# Altium footprint library LimeNet-Micro_2v1.PcbLib: 86 footprints (part 6 of 6)
Each footprint in its own frame and in the unit in brackets; x right, y up, seen from the top. Pads: shape width x height; smd on the part's side, far side on the other; paste and mask are expansions set on the pad; w line width, h text height; cw(c..) or ccw(c..) is an arc to the next point about the centre after c.
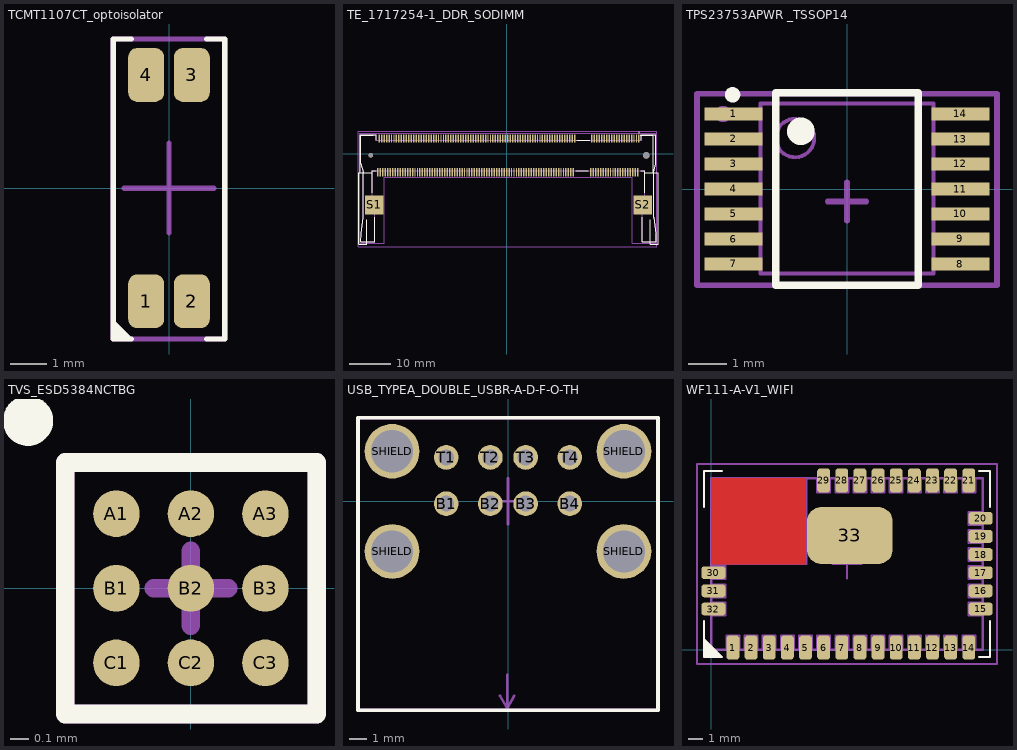
[diagram p5: the footprints below, top view; thin cyan lines are the x and y axes]

## TCMT1107CT_optoisolator [mm]
pads (4):
  rrect50% 1x1.5 smd mask+0.05: 1(-0.635,-3.15) 2(0.635,-3.15) 3(0.635,3.15) 4(-0.635,3.15)
Top Overlay:
  region: -1,-4.2 -1.55,-3.65 -1.55,-4.2
  lines w0.15: -1.05,-4.2 -1.55,-4.2 -1.55,4.15 -1.05,4.15 ; 1.05,-4.2 1.55,-4.2 1.55,4.15 1.05,4.15
Mechanical 15:
  lines w0.15: -1.55,-4.2 -1.55,4.15 1.55,4.15 1.55,-4.2 -1.5,-4.2 ; -1.25,0 0,0 ; 0,-1.25 0,0 ; 0,1.25 0,0 ; 1.25,0 0,0
  text ".Designator" at 0.385,2.15 h0.55
  text "1" at -1.365,-3.475 h0.55
  text "4" at -1.365,3.7 h0.55
3D body "User Library-ACPL-217-56DE.step": height 2.01, standoff -0.12, extent -1.3,-3.55 1.3,3.45

## TE_1717254-1_DDR_SODIMM [mm]
pads (204):
  rect 0.35x2 smd mask+0.05: 1(32.025,3.75) 2(31.725,-4.45) 3(31.425,3.75) 4(31.125,-4.45) 5(30.825,3.75) 6(30.525,-4.45) 7(30.225,3.75) 8(29.925,-4.45) 9(29.625,3.75) 10(29.325,-4.45) 11(29.025,3.75) 12(28.725,-4.45) 13(28.425,3.75) 14(28.125,-4.45) 15(27.825,3.75) 16(27.525,-4.45) 17(27.225,3.75) 18(26.925,-4.45) 19(26.625,3.75) 20(26.325,-4.45) 21(26.025,3.75) 22(25.725,-4.45) 23(25.425,3.75) 24(25.125,-4.45) 25(24.825,3.75) 26(24.525,-4.45) 27(24.225,3.75) 28(23.925,-4.45) 29(23.625,3.75) 30(23.325,-4.45) 31(23.025,3.75) 32(22.725,-4.45) 33(22.425,3.75) 34(22.125,-4.45) 35(21.825,3.75) 36(21.525,-4.45) 37(21.225,3.75) 38(20.925,-4.45) 39(20.625,3.75) 40(20.325,-4.45) 41(16.425,3.75) 42(16.125,-4.45) 43(15.825,3.75) 44(15.525,-4.45) 45(15.225,3.75) 46(14.925,-4.45) 47(14.625,3.75) 48(14.325,-4.45) 49(14.025,3.75) 50(13.725,-4.45) 51(13.425,3.75) 52(13.125,-4.45) 53(12.825,3.75) 54(12.525,-4.45) 55(12.225,3.75) 56(11.925,-4.45) 57(11.625,3.75) 58(11.325,-4.45) 59(11.025,3.75) 60(10.725,-4.45) 61(10.425,3.75) 62(10.125,-4.45) 63(9.825,3.75) 64(9.525,-4.45) 65(9.225,3.75) 66(8.925,-4.45) 67(8.625,3.75) 68(8.325,-4.45) 69(8.025,3.75) 70(7.725,-4.45) 71(7.425,3.75) 72(7.125,-4.45) 73(6.825,3.75) 74(6.525,-4.45) 75(6.225,3.75) 76(5.925,-4.45) 77(5.625,3.75) 78(5.325,-4.45) 79(5.025,3.75) 80(4.725,-4.45) 81(4.425,3.75) 82(4.125,-4.45) 83(3.825,3.75) 84(3.525,-4.45) 85(3.225,3.75) 86(2.925,-4.45) 87(2.625,3.75) 88(2.325,-4.45) 89(2.025,3.75) 90(1.725,-4.45) 91(1.425,3.75) 92(1.125,-4.45) 93(0.825,3.75) 94(0.525,-4.45) 95(0.225,3.75) 96(-0.075,-4.45) 97(-0.375,3.75) 98(-0.675,-4.45) 99(-0.975,3.75) 100(-1.275,-4.45) 101(-1.575,3.75) 102(-1.875,-4.45) 103(-2.175,3.75) 104(-2.475,-4.45) 105(-2.775,3.75) 106(-3.075,-4.45) 107(-3.375,3.75) 108(-3.675,-4.45) 109(-3.975,3.75) 110(-4.275,-4.45) 111(-4.575,3.75) 112(-4.875,-4.45) 113(-5.175,3.75) 114(-5.475,-4.45) 115(-5.775,3.75) 116(-6.075,-4.45) 117(-6.375,3.75) 118(-6.675,-4.45) 119(-6.975,3.75) 120(-7.275,-4.45) 121(-7.575,3.75) 122(-7.875,-4.45) 123(-8.175,3.75) 124(-8.475,-4.45) 125(-8.775,3.75) 126(-9.075,-4.45) 127(-9.375,3.75) 128(-9.675,-4.45) 129(-9.975,3.75) 130(-10.275,-4.45) 131(-10.575,3.75) 132(-10.875,-4.45) 133(-11.175,3.75) 134(-11.475,-4.45) 135(-11.775,3.75) 136(-12.075,-4.45) 137(-12.375,3.75) 138(-12.675,-4.45) 139(-12.975,3.75) 140(-13.275,-4.45) 141(-13.575,3.75) 142(-13.875,-4.45) 143(-14.175,3.75) 144(-14.475,-4.45) 145(-14.775,3.75) 146(-15.075,-4.45) 147(-15.375,3.75) 148(-15.675,-4.45) 149(-15.975,3.75) 150(-16.275,-4.45) 151(-16.575,3.75) 152(-16.875,-4.45) 153(-17.175,3.75) 154(-17.475,-4.45) 155(-17.775,3.75) 156(-18.075,-4.45) 157(-18.375,3.75) 158(-18.675,-4.45) 159(-18.975,3.75) 160(-19.275,-4.45) 161(-19.575,3.75) 162(-19.875,-4.45) 163(-20.175,3.75) 164(-20.475,-4.45) 165(-20.775,3.75) 166(-21.075,-4.45) 167(-21.375,3.75) 168(-21.675,-4.45) 169(-21.975,3.75) 170(-22.275,-4.45) 171(-22.575,3.75) 172(-22.875,-4.45) 173(-23.175,3.75) 174(-23.475,-4.45) 175(-23.775,3.75) 176(-24.075,-4.45) 177(-24.375,3.75) 178(-24.675,-4.45) 179(-24.975,3.75) 180(-25.275,-4.45) 181(-25.575,3.75) 182(-25.875,-4.45) 183(-26.175,3.75) 184(-26.475,-4.45) 185(-26.775,3.75) 186(-27.075,-4.45) 187(-27.375,3.75) 188(-27.675,-4.45) 189(-27.975,3.75) 190(-28.275,-4.45) 191(-28.575,3.75) 192(-28.875,-4.45) 193(-29.175,3.75) 194(-29.475,-4.45) 195(-29.775,3.75) 196(-30.075,-4.45) 197(-30.375,3.75) 198(-30.675,-4.45) 199(-30.975,3.75) 200(-31.275,-4.45)
  round 1.1 hole 1.1 unplated: None(-33.025,-0.35)
  round 1.6 hole 1.6 unplated: None(33.775,-0.35)
  rect 4.5x4.6 smd: S1(-32.175,-12.35) S2(32.925,-12.35)
Top Overlay:
  circle w0.15: c32.025,5.2 r0.1
  lines w0.15: -35.512,-4.505 -35.891,-4.505 -35.891,-21.923 -34.031,-21.923 -34.031,-15.999 ; -35.375,-21.35 -32.025,-21.35 -32.025,-15.35 ; -35.375,-21.3 -35.325,-19.35 -34.825,-15.35 -34.825,-4.4 -35.375,-2.35 -35.375,4.65 -31.625,4.65 -31.625,3.35 ; -32.625,-9.35 -32.625,-4.05 -31.725,-4.05 ; -32.625,-4.505 -35.5,-4.505 -35.5,4.5 -32.385,4.5 ; 16.675,-4.05 19.675,-4.05 ; 16.975,3.35 20.075,3.35 ; 32.385,4.499 35.5,4.499 35.5,-4.505 ; 32.475,-4.05 33.375,-4.05 33.375,-9.35 ; 32.575,3.35 32.575,4.65 36.125,4.65 36.125,-2.35 35.575,-4.4 35.575,-15.35 36.075,-19.35 36.125,-21.3 ; 32.775,-15.35 32.775,-21.35 36.125,-21.35 ; 33.375,-4.505 36.25,-4.505 ; 34.781,-15.999 34.781,-21.923 36.641,-21.923 36.641,-4.505 36.262,-4.505
Mechanical 13:
  lines w0.05: -35.625,-21.6 -29.675,-21.6 -29.675,-5.7 30.425,-5.7 30.425,-21.6 36.375,-21.6 36.375,5 -35.625,5 -35.625,-21.6
  lines w0.127: -35.375,-21.35 -32.025,-21.35 -32.025,-14.05 -31.275,-14.05 -31.275,-10.45 -32.625,-10.45 -32.625,-4.05 33.375,-4.05 33.375,-10.45 32.025,-10.45 32.025,-14.05 32.775,-14.05 32.775,-21.35 36.065,-21.35 ; -35.375,-21.3 -35.325,-19.35 -34.825,-15.35 -34.825,-4.4 -35.375,-2.35 -35.375,4.65 -31.625,4.65 -31.625,3.35 32.575,3.35 32.575,4.65 36.125,4.65 36.125,-2.35 35.575,-4.4 35.575,-15.35 36.075,-19.35 36.075,-21.34
Mechanical 15:
  lines w0.3: -36.1,-22.5 36.3,-22.5 36.3,5.5 -36.1,5.5 -36.1,-22.5
  text "199" at -33,3.5 h0.55
  text "200" at -33,-4.5 h0.55
  text "42" at 16,-4.5 h0.55
  text "41" at 16,3.5 h0.55
  text "39" at 19.5,3.5 h0.55
  text "40" at 19,-4.5 h0.55
  text "2" at 31.5,-4.5 h0.55
  text "1" at 31.5,4 h0.55
  text ".Designator" at 0,0 h0.55
3D body "c-1473005-4-j1-3d.stp": height 5.27, standoff -0.63, extent -35.375,-21.425 36.125,4.625
3D body "User Library-compute_module.step": height 4.1, standoff 2.6, extent -33.55,-30.5 34.05,-0.5

## TPS23753APWR _TSSOP14 [mm]
pads (14):
  rect 1.5x0.35 smd: 1(-2.95,1.95) 2(-2.95,1.3) 3(-2.95,0.65) 4(-2.95,0) 5(-2.95,-0.65) 6(-2.95,-1.3) 7(-2.95,-1.95) 8(2.95,-1.95) 9(2.95,-1.3) 10(2.95,-0.65) 11(2.95,0) 12(2.95,0.65) 13(2.95,1.3) 14(2.95,1.95)
Top Overlay:
  circle w0.25: c-2.975,2.45 r0.075
  circle w0.6: c-1.2,1.5 r0.056
  lines w0.2: -1.85,-2.5 -1.85,2.5 1.85,2.5 1.85,-2.5 -1.85,-2.5
Mechanical 13:
  circle w0.1: c-1.35,1.325 r0.5
  lines w0.1: -2.25,-2.2 -2.25,2.225 2.25,2.225 2.25,-2.2 -2.25,-2.2
Mechanical 15:
  circle w0.35: c-3.225,1.95 r0.035
  lines w0.15: -0.5,-0.325 0.5,-0.325 ; 0,-0.825 0,0.175 ; -3.9,-2.5 -3.9,2.475 3.9,2.475 3.9,-2.5 -3.9,-2.5
  text ".Designator" at -0.729,0.539 h0.55
3D body "User Library-TSSOP14-1.step": height 1.1, standoff 0, extent -3.2,-2.5 3.2,2.5

## TVS_ESD5384NCTBG [mm]
pads (9):
  round 0.25 smd mask+0.05: A1(-0.4,0.4) A2(0,0.4) A3(0.4,0.4) B1(-0.4,0) B2(0,0) B3(0.4,0) C1(-0.4,-0.4) C2(0,-0.4) C3(0.4,-0.4)
Top Overlay:
  circle w0.2: c-0.875,0.9 r0.035
  lines w0.1: -0.675,-0.675 -0.675,0.675 0.675,0.675 0.675,-0.675 -0.675,-0.675
Top Solder:
  region: -0.575,0.575 -0.575,-0.575 0.575,-0.575 0.575,0.575
Mechanical 15:
  lines w0.1: -0.2,0 0,0 ; 0,-0.2 0,0 ; 0,0.2 0,0 ; 0.2,0 0,0 ; -0.675,-0.675 -0.675,0.675 0.675,0.675 0.675,-0.675 -0.675,-0.675
  text "A1" at -0.525,-0.05 h0.25
  text ".Designator" at -0.5,2.325 h0.55
  text "C3" at 0.05,-0.575 h0.25
3D body: height 0.58, standoff 0, extent -0.5,0.3 -0.3,0.5
3D body: height 0.57, standoff 0, extent -0.57,-0.57 0.57,0.57

## USB_TYPEA_DOUBLE_USBR-A-D-F-O-TH [mm]
pads (12):
  round 1.4 hole 0.9 mask+0.05: B1(-3.5,-0.13) B2(-1,-0.13) B3(1,-0.13) B4(3.5,-0.13) T1(-3.5,2.49) T2(-1,2.49) T3(1,2.49) T4(3.5,2.49)
  round 3.1 hole 2.4 mask+0.05: SHIELD(-6.57,-2.84) SHIELD(-6.57,2.84) SHIELD(6.57,-2.84) SHIELD(6.57,2.84)
Top Overlay:
  lines w0.2: -8.5,-11.85 -8.5,4.75 8.5,4.75 8.5,-11.85 -8.5,-11.85
Mechanical 15:
  lines w0.15: -1.3,0 0,0 ; -0.45,-11.025 -0.05,-11.725 ; -0.05,-9.825 -0.05,-11.725 ; 0,-1.3 0,0 ; 0,1.3 0,0 ; 0.35,-11.025 -0.05,-11.725 ; 1.3,0 0,0
  lines w0.2: -8.5,-11.85 8.5,-11.85 8.5,4.75 -8.5,4.75 -8.5,-11.85
  text "PCB edge" at 1.955,-8.565 h0.55
  text "T4" at 4.105,2.985 h0.55
  text ".Designator" at 0.83,-1.815 h0.55
  text "B4" at 4.105,0.285 h0.55
  text "B1" at -3.045,0.26 h0.55
  text "T1" at -2.97,3.06 h0.55
3D body "USBR-A-D-F-O-TH.stp": height 16.1, standoff -4.2, extent -7.799,-13.55 7.798,4.1

## WF111-A-V1_WIFI [mm]
pads (33):
  rrect50% 0.9x1.7 smd mask+0.05: 1(1.515,0.15) 2(2.785,0.15) 3(4.055,0.15) 4(5.325,0.15) 5(6.595,0.15) 6(7.865,0.15) 7(9.135,0.15) 8(10.405,0.15) 9(11.675,0.15) 10(12.945,0.15) 11(14.215,0.15) 12(15.485,0.15) 13(16.755,0.15) 14(18.025,0.15) 21(18.025,11.85) 22(16.755,11.85) 23(15.485,11.85) 24(14.215,11.85) 25(12.945,11.85) 26(11.675,11.85) 27(10.405,11.85) 28(9.135,11.85) 29(7.865,11.85)
  rrect50% 1.7x0.9 smd mask+0.05: 15(18.85,2.85) 16(18.85,4.12) 17(18.85,5.39) 18(18.85,6.66) 19(18.85,7.93) 20(18.85,9.2) 30(0.15,5.39) 31(0.15,4.12) 32(0.15,2.85)
  rrect50% 6x4 smd mask+0.05: 33(9.7,8)
Top Layer:
  pour cut-out: 0,6 0,12 6.6,12 6.6,6
Top Overlay:
  region: 0.8,-0.5 -0.5,0.8 -0.5,-0.5
  lines w0.15: -0.5,2 -0.5,-0.5 0.75,-0.5 ; -0.5,10 -0.5,12.5 0.75,12.5 ; 18.75,-0.5 19.5,-0.5 19.5,2 ; 18.75,12.5 19.5,12.5 19.5,10
Mechanical 13:
  lines w0.15: 0,6 6.665,6 ; 0,6.6 5.4,12 ; 0,7.9 4.1,12 ; 0,9.2 2.8,12 ; 0,10.5 1.5,12 ; 0.7,6 6.7,12 ; 2,6 6.65,10.65 ; 3.3,6 6.65,9.35 ; 4.6,6 6.65,8.05 ; 5.9,6 6.633,6.732 ; 6.665,6.085 6.665,12 ; 0,0 0,12 19,12 19,0 0,0 ; 0,2.4 0,3.3 1,3.3 1,2.4 0,2.4 ; 0,3.67 1,3.67 1,4.57 0,4.57 0,3.67 ; 0,4.94 1,4.94 1,5.84 0,5.84 0,4.94 ; 1.065,0 1.965,0 1.965,1 1.065,1 1.065,0 ; 2.335,0 3.235,0 3.235,1 2.335,1 2.335,0 ; 3.605,0 3.605,1 4.505,1 4.505,0 3.605,0 ; 4.875,0 4.875,1 5.775,1 5.775,0 4.875,0 ; 6.145,0 6.145,1 7.045,1 7.045,0 6.145,0 ; 7.415,0 7.415,1 8.315,1 8.315,0 7.415,0 ; 7.415,11 8.315,11 8.315,12 7.415,12 7.415,11 ; 8.685,0 8.685,1 9.585,1 9.585,0 8.685,0 ; 8.685,11 9.585,11 9.585,12 8.685,12 8.685,11 ; 9.955,0 9.955,1 10.855,1 10.855,0 9.955,0 ; 9.955,11 10.855,11 10.855,12 9.955,12 9.955,11 ; 11.225,0 12.125,0 12.125,1 11.225,1 11.225,0 ; 11.225,11 11.225,12 12.125,12 12.125,11 11.225,11 ; 12.495,0 13.395,0 13.395,1 12.495,1 12.495,0 ; 12.495,11 12.495,12 13.395,12 13.395,11 12.495,11 ; 13.765,0 14.665,0 14.665,1 13.765,1 13.765,0 ; 13.765,11 13.765,12 14.665,12 14.665,11 13.765,11 ; 15.035,0 15.935,0 15.935,1 15.035,1 15.035,0 ; 15.035,11 15.035,12 15.935,12 15.935,11 15.035,11 ; 16.305,0 17.205,0 17.205,1 16.305,1 16.305,0 ; 16.305,11 16.305,12 17.205,12 17.205,11 16.305,11 ; 17.575,0 17.575,1 18.475,1 18.475,0 17.575,0 ; 17.575,11 18.475,11 18.475,12 17.575,12 17.575,11 ; 18,2.4 18,3.3 19,3.3 19,2.4 18,2.4 ; 18,3.67 19,3.67 19,4.57 18,4.57 18,3.67 ; 18,4.94 19,4.94 19,5.84 18,5.84 18,4.94 ; 18,6.21 19,6.21 19,7.11 18,7.11 18,6.21 ; 18,7.48 19,7.48 19,8.38 18,8.38 18,7.48 ; 18,8.75 19,8.75 19,9.65 18,9.65 18,8.75
  text "NO GND" at 2.1,8.5 h0.55
Mechanical 15:
  lines w0.15: 8.5,6 9.5,6 ; 9.5,5 9.5,6 ; 9.5,7 9.5,6 ; 10.5,6 9.5,6 ; -1,-1 20,-1 20,13 -1,13 -1,-1
  text "1" at 1.7,0.54 h0.55
  text "21" at 18.55,12.19 h0.55
  text "29" at 8.35,12.215 h0.55
  text "14" at 18.525,0.54 h0.55
  text ".Designator" at 10.425,4.965 h0.55
3D body: height 2, standoff 0.8, extent 0.225,9.725 1.225,11.725
3D body: height 2, standoff 0.8, extent 6.75,1.25 19,10.75
3D body: height 0.8, standoff 0, extent 0,0 19,12